# Altium footprint library Components.PcbLib: 260 footprints (part 4 of 17)
Each footprint in its own frame and in the unit in brackets; x right, y up, seen from the top. Pads: shape width x height; smd on the part's side, far side on the other; paste and mask are expansions set on the pad; w line width, h text height; cw(c..) or ccw(c..) is an arc to the next point about the centre after c.
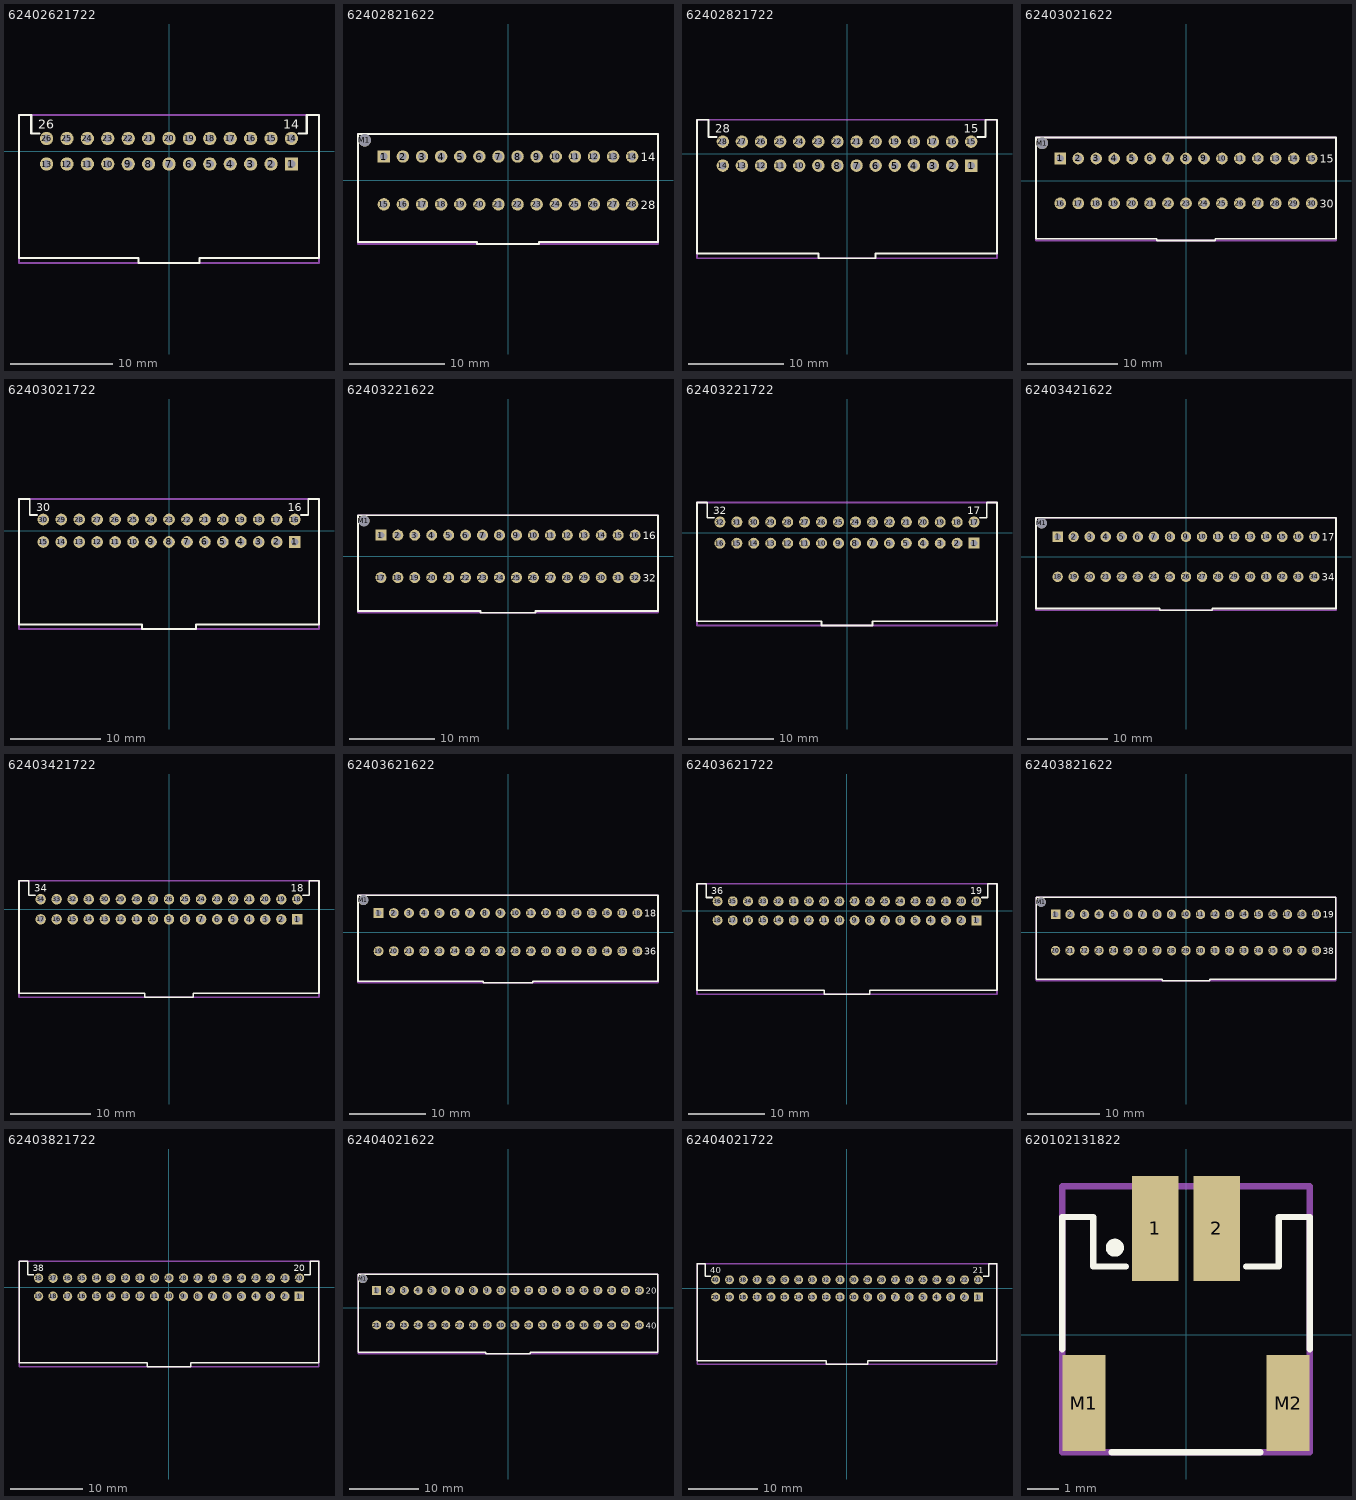
[diagram p3: the footprints below, top view; thin cyan lines are the x and y axes]

## 62402621722 [mm] "2.00mm Male Dual Row Horizontal Shrouded Header with positive locking, 26p"
height 11.7
pads (26):
  rect 1.3x1.3 hole 0.8: 1(12,-1.25)
  round 1.3 hole 0.8: 2(10,-1.25) 3(8,-1.25) 4(6,-1.25) 5(4,-1.25) 6(2,-1.25) 7(0,-1.25) 8(-2,-1.25) 9(-4,-1.25) 10(-6,-1.25) 11(-8,-1.25) 12(-10,-1.25) 13(-12,-1.25) 14(12,1.25) 15(10,1.25) 16(8,1.25) 17(6,1.25) 18(4,1.25) 19(2,1.25) 20(0,1.25) 21(-2,1.25) 22(-4,1.25) 23(-6,1.25) 24(-8,1.25) 25(-10,1.25) 26(-12,1.25)
Top Overlay:
  lines w0.2: -12.68,1.75 -13.5,1.75 -13.5,3.55 -14.7,3.55 -14.7,-10.45 -3,-10.45 -3,-10.95 3,-10.95 3,-10.45 14.7,-10.45 14.7,3.55 13.5,3.55 13.5,1.75 12.68,1.75
  text "14" at 11.2,2.2 h0.89
  text "26" at -12.8,2.2 h0.89
Mechanical 13:
  lines w0.2: -14.7,-10.95 -14.7,3.55 14.7,3.55 14.7,-10.95 -14.7,-10.95
3D body "62402621722.stp": height 11.75, standoff -3.15, extent -14.7,-10.95 14.7,3.55

## 62402821622 [mm] "2.00mm Male Dual Row Vertical Shrouded Header with positive locking, 28p"
height 11.6
pads (29):
  rect 1.3x1.3 hole 0.8: 1(-13,2.5)
  round 1.3 hole 0.8: 2(-11,2.5) 3(-9,2.5) 4(-7,2.5) 5(-5,2.5) 6(-3,2.5) 7(-1,2.5) 8(1,2.5) 9(3,2.5) 10(5,2.5) 11(7,2.5) 12(9,2.5) 13(11,2.5) 14(13,2.5) 15(-13,-2.5) 16(-11,-2.5) 17(-9,-2.5) 18(-7,-2.5) 19(-5,-2.5) 20(-3,-2.5) 21(-1,-2.5) 22(1,-2.5) 23(3,-2.5) 24(5,-2.5) 25(7,-2.5) 26(9,-2.5) 27(11,-2.5) 28(13,-2.5)
  round 1.3 hole 1.3 unplated: M1(-15,4.2)
Top Overlay:
  lines w0.2: -15.7,-6.45 -15.7,4.85 15.7,4.85 15.7,-6.45 3.25,-6.45 3.25,-6.65 -3.25,-6.65 -3.25,-6.45 -15.7,-6.45
  text "14" at 13.9,2 h0.89
  text "28" at 13.9,-3 h0.89
Mechanical 13:
  lines w0.2: -15.7,-6.65 15.7,-6.65 15.7,4.85 -15.7,4.85 -15.7,-6.65
3D body "62402821622.stp": height 9.82, standoff -3.13, extent -15.7,-6.65 15.7,4.85

## 62402821722 [mm] "2.00mm Male Dual Row Horizontal Shrouded Header with positive locking, 28p"
height 11.7
pads (28):
  rect 1.3x1.3 hole 0.8: 1(13,-1.25)
  round 1.3 hole 0.8: 2(11,-1.25) 3(9,-1.25) 4(7,-1.25) 5(5,-1.25) 6(3,-1.25) 7(1,-1.25) 8(-1,-1.25) 9(-3,-1.25) 10(-5,-1.25) 11(-7,-1.25) 12(-9,-1.25) 13(-11,-1.25) 14(-13,-1.25) 15(13,1.25) 16(11,1.25) 17(9,1.25) 18(7,1.25) 19(5,1.25) 20(3,1.25) 21(1,1.25) 22(-1,1.25) 23(-3,1.25) 24(-5,1.25) 25(-7,1.25) 26(-9,1.25) 27(-11,1.25) 28(-13,1.25)
Top Overlay:
  lines w0.2: -13.68,1.75 -14.5,1.75 -14.5,3.55 -15.7,3.55 -15.7,-10.45 -3,-10.45 -3,-10.95 3,-10.95 3,-10.45 15.7,-10.45 15.7,3.55 14.5,3.55 14.5,1.75 13.68,1.75
  text "15" at 12.2,2.2 h0.89
  text "28" at -13.8,2.2 h0.89
Mechanical 13:
  lines w0.2: -15.7,-10.95 15.7,-10.95 15.7,3.55 -15.7,3.55 -15.7,-10.95
3D body "62402821722.stp": height 11.75, standoff -3.15, extent -15.7,-10.95 15.7,3.55

## 62403021622 [mm] "2.00mm Male Dual Row Vertical Shrouded Header with positive locking, 30p"
height 11.6
pads (31):
  rect 1.3x1.3 hole 0.8: 1(-14,2.5)
  round 1.3 hole 0.8: 2(-12,2.5) 3(-10,2.5) 4(-8,2.5) 5(-6,2.5) 6(-4,2.5) 7(-2,2.5) 8(0,2.5) 9(2,2.5) 10(4,2.5) 11(6,2.5) 12(8,2.5) 13(10,2.5) 14(12,2.5) 15(14,2.5) 16(-14,-2.5) 17(-12,-2.5) 18(-10,-2.5) 19(-8,-2.5) 20(-6,-2.5) 21(-4,-2.5) 22(-2,-2.5) 23(0,-2.5) 24(2,-2.5) 25(4,-2.5) 26(6,-2.5) 27(8,-2.5) 28(10,-2.5) 29(12,-2.5) 30(14,-2.5)
  round 1.3 hole 1.3 unplated: M1(-16,4.2)
Top Overlay:
  lines w0.2: -16.7,-6.45 -16.7,4.85 16.7,4.85 16.7,-6.45 3.25,-6.45 3.25,-6.65 -3.25,-6.65 -3.25,-6.45 -16.7,-6.45
  text "15" at 14.9,2 h0.89
  text "30" at 14.9,-3 h0.89
Mechanical 13:
  lines w0.2: -16.7,-6.65 -16.7,4.85 16.7,4.85 16.7,-6.65 -16.7,-6.65
3D body "62403021622.stp": height 9.82, standoff -3.13, extent -16.7,-6.65 16.7,4.85

## 62403021722 [mm] "2.00mm Male Dual Row Horizontal Shrouded Header with positive locking, 30p"
height 11.7
pads (30):
  rect 1.3x1.3 hole 0.8: 1(14,-1.25)
  round 1.3 hole 0.8: 2(12,-1.25) 3(10,-1.25) 4(8,-1.25) 5(6,-1.25) 6(4,-1.25) 7(2,-1.25) 8(0,-1.25) 9(-2,-1.25) 10(-4,-1.25) 11(-6,-1.25) 12(-8,-1.25) 13(-10,-1.25) 14(-12,-1.25) 15(-14,-1.25) 16(14,1.25) 17(12,1.25) 18(10,1.25) 19(8,1.25) 20(6,1.25) 21(4,1.25) 22(2,1.25) 23(0,1.25) 24(-2,1.25) 25(-4,1.25) 26(-6,1.25) 27(-8,1.25) 28(-10,1.25) 29(-12,1.25) 30(-14,1.25)
Top Overlay:
  lines w0.2: -14.68,1.75 -15.5,1.75 -15.5,3.55 -16.7,3.55 -16.7,-10.45 -3,-10.45 -3,-10.95 3,-10.95 3,-10.45 16.7,-10.45 16.7,3.55 15.5,3.55 15.5,1.75 14.68,1.75
  text "30" at -14.8,2.2 h0.89
  text "16" at 13.2,2.2 h0.89
Mechanical 13:
  lines w0.2: -16.7,-10.95 16.7,-10.95 16.7,3.55 -16.7,3.55 -16.7,-10.95
3D body "62403021722.stp": height 11.75, standoff -3.15, extent -16.7,-10.95 16.7,3.55

## 62403221622 [mm] "2.00mm Male Dual Row Vertical Shrouded Header with positive locking, 32p"
height 11.6
pads (33):
  rect 1.3x1.3 hole 0.8: 1(-15,2.5)
  round 1.3 hole 0.8: 2(-13,2.5) 3(-11,2.5) 4(-9,2.5) 5(-7,2.5) 6(-5,2.5) 7(-3,2.5) 8(-1,2.5) 9(1,2.5) 10(3,2.5) 11(5,2.5) 12(7,2.5) 13(9,2.5) 14(11,2.5) 15(13,2.5) 16(15,2.5) 17(-15,-2.5) 18(-13,-2.5) 19(-11,-2.5) 20(-9,-2.5) 21(-7,-2.5) 22(-5,-2.5) 23(-3,-2.5) 24(-1,-2.5) 25(1,-2.5) 26(3,-2.5) 27(5,-2.5) 28(7,-2.5) 29(9,-2.5) 30(11,-2.5) 31(13,-2.5) 32(15,-2.5)
  round 1.3 hole 1.3 unplated: M1(-17,4.2)
Top Overlay:
  lines w0.2: -17.7,-6.45 -3.25,-6.45 -3.25,-6.65 3.25,-6.65 3.25,-6.45 17.7,-6.45 17.7,4.85 -17.7,4.85 -17.7,-6.45
  text "32" at 15.9,-3 h0.89
  text "16" at 15.9,2 h0.89
Mechanical 13:
  lines w0.2: -17.7,-6.65 -17.7,4.85 17.7,4.85 17.7,-6.65 -17.7,-6.65
3D body "62403221622.stp": height 9.82, standoff -3.13, extent -17.7,-6.65 17.7,4.85

## 62403221722 [mm] "2.00mm Male Dual Row Horizontal Shrouded Header with positive locking, 32p"
height 11.7
pads (32):
  rect 1.3x1.3 hole 0.8: 1(15,-1.25)
  round 1.3 hole 0.8: 2(13,-1.25) 3(11,-1.25) 4(9,-1.25) 5(7,-1.25) 6(5,-1.25) 7(3,-1.25) 8(1,-1.25) 9(-1,-1.25) 10(-3,-1.25) 11(-5,-1.25) 12(-7,-1.25) 13(-9,-1.25) 14(-11,-1.25) 15(-13,-1.25) 16(-15,-1.25) 17(15,1.25) 18(13,1.25) 19(11,1.25) 20(9,1.25) 21(7,1.25) 22(5,1.25) 23(3,1.25) 24(1,1.25) 25(-1,1.25) 26(-3,1.25) 27(-5,1.25) 28(-7,1.25) 29(-9,1.25) 30(-11,1.25) 31(-13,1.25) 32(-15,1.25)
Top Overlay:
  lines w0.2: -15.68,1.75 -16.5,1.75 -16.5,3.55 -17.7,3.55 -17.7,-10.45 -3,-10.45 -3,-10.95 3,-10.95 3,-10.45 17.7,-10.45 17.7,3.55 16.5,3.55 16.5,1.75 15.68,1.75
  text "17" at 14.2,2.2 h0.89
  text "32" at -15.8,2.2 h0.89
Mechanical 13:
  lines w0.2: -17.7,-10.95 17.7,-10.95 17.7,3.55 -17.7,3.55 -17.7,-10.95
3D body "62403221722.stp": height 11.75, standoff -3.15, extent -17.7,-10.95 17.7,3.55

## 62403421622 [mm] "2.00mm Male Dual Row Vertical Shrouded Header with positive locking, 34p"
height 11.6
pads (35):
  rect 1.3x1.3 hole 0.8: 1(-16,2.5)
  round 1.3 hole 0.8: 2(-14,2.5) 3(-12,2.5) 4(-10,2.5) 5(-8,2.5) 6(-6,2.5) 7(-4,2.5) 8(-2,2.5) 9(0,2.5) 10(2,2.5) 11(4,2.5) 12(6,2.5) 13(8,2.5) 14(10,2.5) 15(12,2.5) 16(14,2.5) 17(16,2.5) 18(-16,-2.5) 19(-14,-2.5) 20(-12,-2.5) 21(-10,-2.5) 22(-8,-2.5) 23(-6,-2.5) 24(-4,-2.5) 25(-2,-2.5) 26(0,-2.5) 27(2,-2.5) 28(4,-2.5) 29(6,-2.5) 30(8,-2.5) 31(10,-2.5) 32(12,-2.5) 33(14,-2.5) 34(16,-2.5)
  round 1.3 hole 1.3 unplated: M1(-18,4.2)
Top Overlay:
  lines w0.2: -18.7,-6.45 -3.25,-6.45 -3.25,-6.65 3.25,-6.65 3.25,-6.45 18.7,-6.45 18.7,4.85 -18.7,4.85 -18.7,-6.45
  text "17" at 16.9,2 h0.89
  text "34" at 16.9,-3 h0.89
Mechanical 13:
  lines w0.2: -18.7,-6.65 18.7,-6.65 18.7,4.85 -18.7,4.85 -18.7,-6.65
3D body "62403421622.stp": height 9.82, standoff -3.13, extent -18.7,-6.65 18.7,4.85

## 62403421722 [mm] "2.00mm Male Dual Row Horizontal Shrouded Header with positive locking, 34p"
height 11.7
pads (34):
  rect 1.3x1.3 hole 0.8: 1(16,-1.25)
  round 1.3 hole 0.8: 2(14,-1.25) 3(12,-1.25) 4(10,-1.25) 5(8,-1.25) 6(6,-1.25) 7(4,-1.25) 8(2,-1.25) 9(0,-1.25) 10(-2,-1.25) 11(-4,-1.25) 12(-6,-1.25) 13(-8,-1.25) 14(-10,-1.25) 15(-12,-1.25) 16(-14,-1.25) 17(-16,-1.25) 18(16,1.25) 19(14,1.25) 20(12,1.25) 21(10,1.25) 22(8,1.25) 23(6,1.25) 24(4,1.25) 25(2,1.25) 26(0,1.25) 27(-2,1.25) 28(-4,1.25) 29(-6,1.25) 30(-8,1.25) 31(-10,1.25) 32(-12,1.25) 33(-14,1.25) 34(-16,1.25)
Top Overlay:
  lines w0.2: -16.68,1.75 -17.5,1.75 -17.5,3.55 -18.7,3.55 -18.7,-10.45 -3,-10.45 -3,-10.95 3,-10.95 3,-10.45 18.7,-10.45 18.7,3.55 17.5,3.55 17.5,1.75 16.68,1.75
  text "18" at 15.2,2.2 h0.89
  text "34" at -16.8,2.2 h0.89
Mechanical 13:
  lines w0.2: -18.7,-10.95 -18.7,3.55 18.7,3.55 18.7,-10.95 -18.7,-10.95
3D body "62403421722.stp": height 11.75, standoff -3.15, extent -18.7,-10.95 18.7,3.55

## 62403621622 [mm] "2.00mm Male Dual Row Vertical Shrouded Header with positive locking, 36p"
height 11.6
pads (37):
  rect 1.3x1.3 hole 0.8: 1(-17,2.5)
  round 1.3 hole 0.8: 2(-15,2.5) 3(-13,2.5) 4(-11,2.5) 5(-9,2.5) 6(-7,2.5) 7(-5,2.5) 8(-3,2.5) 9(-1,2.5) 10(1,2.5) 11(3,2.5) 12(5,2.5) 13(7,2.5) 14(9,2.5) 15(11,2.5) 16(13,2.5) 17(15,2.5) 18(17,2.5) 19(-17,-2.5) 20(-15,-2.5) 21(-13,-2.5) 22(-11,-2.5) 23(-9,-2.5) 24(-7,-2.5) 25(-5,-2.5) 26(-3,-2.5) 27(-1,-2.5) 28(1,-2.5) 29(3,-2.5) 30(5,-2.5) 31(7,-2.5) 32(9,-2.5) 33(11,-2.5) 34(13,-2.5) 35(15,-2.5) 36(17,-2.5)
  round 1.3 hole 1.3 unplated: M1(-19,4.2)
Top Overlay:
  lines w0.2: -19.7,-6.45 -3.25,-6.45 -3.25,-6.65 3.25,-6.65 3.25,-6.45 19.7,-6.45 19.7,4.85 -19.7,4.85 -19.7,-6.45
  text "18" at 17.9,2 h0.89
  text "36" at 17.9,-3 h0.89
Mechanical 13:
  lines w0.2: -19.7,-6.65 -19.7,4.85 19.7,4.85 19.7,-6.65 -19.7,-6.65
3D body "62403621622.stp": height 9.82, standoff -3.13, extent -19.7,-6.65 19.7,4.85

## 62403621722 [mm] "2.00mm Male Dual Row Horizontal Shrouded Header with positive locking, 36p"
height 11.7
pads (36):
  rect 1.3x1.3 hole 0.8: 1(17,-1.25)
  round 1.3 hole 0.8: 2(15,-1.25) 3(13,-1.25) 4(11,-1.25) 5(9,-1.25) 6(7,-1.25) 7(5,-1.25) 8(3,-1.25) 9(1,-1.25) 10(-1,-1.25) 11(-3,-1.25) 12(-5,-1.25) 13(-7,-1.25) 14(-9,-1.25) 15(-11,-1.25) 16(-13,-1.25) 17(-15,-1.25) 18(-17,-1.25) 19(17,1.25) 20(15,1.25) 21(13,1.25) 22(11,1.25) 23(9,1.25) 24(7,1.25) 25(5,1.25) 26(3,1.25) 27(1,1.25) 28(-1,1.25) 29(-3,1.25) 30(-5,1.25) 31(-7,1.25) 32(-9,1.25) 33(-11,1.25) 34(-13,1.25) 35(-15,1.25) 36(-17,1.25)
Top Overlay:
  lines w0.2: -17.68,1.75 -18.5,1.75 -18.5,3.55 -19.7,3.55 -19.7,-10.45 -3,-10.45 -3,-10.95 3,-10.95 3,-10.45 19.7,-10.45 19.7,3.55 18.5,3.55 18.5,1.75 17.68,1.75
  text "19" at 16.2,2.2 h0.89
  text "36" at -17.8,2.2 h0.89
Mechanical 13:
  lines w0.2: -19.7,-10.95 19.7,-10.95 19.7,3.55 -19.7,3.55 -19.7,-10.95
3D body "62403621722.stp": height 11.75, standoff -3.15, extent -19.7,-10.95 19.7,3.55

## 62403821622 [mm] "2.00mm Male Dual Row Vertical Shrouded Header with positive locking, 38p"
height 11.6
pads (39):
  rect 1.3x1.3 hole 0.8: 1(-18,2.5)
  round 1.3 hole 0.8: 2(-16,2.5) 3(-14,2.5) 4(-12,2.5) 5(-10,2.5) 6(-8,2.5) 7(-6,2.5) 8(-4,2.5) 9(-2,2.5) 10(0,2.5) 11(2,2.5) 12(4,2.5) 13(6,2.5) 14(8,2.5) 15(10,2.5) 16(12,2.5) 17(14,2.5) 18(16,2.5) 19(18,2.5) 20(-18,-2.5) 21(-16,-2.5) 22(-14,-2.5) 23(-12,-2.5) 24(-10,-2.5) 25(-8,-2.5) 26(-6,-2.5) 27(-4,-2.5) 28(-2,-2.5) 29(0,-2.5) 30(2,-2.5) 31(4,-2.5) 32(6,-2.5) 33(8,-2.5) 34(10,-2.5) 35(12,-2.5) 36(14,-2.5) 37(16,-2.5) 38(18,-2.5)
  round 1.3 hole 1.3 unplated: M1(-20,4.2)
Top Overlay:
  lines w0.2: -20.7,-6.45 -3.25,-6.45 -3.25,-6.65 3.25,-6.65 3.25,-6.45 20.7,-6.45 20.7,4.85 -20.7,4.85 -20.7,-6.45
  text "19" at 18.9,2 h0.89
  text "38" at 18.9,-3 h0.89
Mechanical 13:
  lines w0.2: -20.7,-6.65 20.7,-6.65 20.7,4.85 -20.7,4.85 -20.7,-6.65
3D body "62403821622.stp": height 9.82, standoff -3.13, extent -20.7,-6.65 20.7,4.85

## 62403821722 [mm] "2.00mm Male Dual Row Horizontal Shrouded Header with positive locking, 38p"
height 11.7
pads (38):
  rect 1.3x1.3 hole 0.8: 1(18,-1.25)
  round 1.3 hole 0.8: 2(16,-1.25) 3(14,-1.25) 4(12,-1.25) 5(10,-1.25) 6(8,-1.25) 7(6,-1.25) 8(4,-1.25) 9(2,-1.25) 10(0,-1.25) 11(-2,-1.25) 12(-4,-1.25) 13(-6,-1.25) 14(-8,-1.25) 15(-10,-1.25) 16(-12,-1.25) 17(-14,-1.25) 18(-16,-1.25) 19(-18,-1.25) 20(18,1.25) 21(16,1.25) 22(14,1.25) 23(12,1.25) 24(10,1.25) 25(8,1.25) 26(6,1.25) 27(4,1.25) 28(2,1.25) 29(0,1.25) 30(-2,1.25) 31(-4,1.25) 32(-6,1.25) 33(-8,1.25) 34(-10,1.25) 35(-12,1.25) 36(-14,1.25) 37(-16,1.25) 38(-18,1.25)
Top Overlay:
  lines w0.2: -18.68,1.75 -19.5,1.75 -19.5,3.55 -20.7,3.55 -20.7,-10.45 -3,-10.45 -3,-10.95 3,-10.95 3,-10.45 20.7,-10.45 20.7,3.55 19.5,3.55 19.5,1.75 18.68,1.75
  text "20" at 17.2,2.2 h0.89
  text "38" at -18.8,2.2 h0.89
Mechanical 13:
  lines w0.2: -20.7,-10.95 20.7,-10.95 20.7,3.55 -20.7,3.55 -20.7,-10.95
3D body "62403821722.stp": height 11.75, standoff -3.15, extent -20.7,-10.95 20.7,3.55

## 62404021622 [mm] "2.00mm Male Dual Row Vertical Shrouded Header with positive locking, 40p"
height 11.6
pads (41):
  rect 1.3x1.3 hole 0.8: 1(-19,2.5)
  round 1.3 hole 0.8: 2(-17,2.5) 3(-15,2.5) 4(-13,2.5) 5(-11,2.5) 6(-9,2.5) 7(-7,2.5) 8(-5,2.5) 9(-3,2.5) 10(-1,2.5) 11(1,2.5) 12(3,2.5) 13(5,2.5) 14(7,2.5) 15(9,2.5) 16(11,2.5) 17(13,2.5) 18(15,2.5) 19(17,2.5) 20(19,2.5) 21(-19,-2.5) 22(-17,-2.5) 23(-15,-2.5) 24(-13,-2.5) 25(-11,-2.5) 26(-9,-2.5) 27(-7,-2.5) 28(-5,-2.5) 29(-3,-2.5) 30(-1,-2.5) 31(1,-2.5) 32(3,-2.5) 33(5,-2.5) 34(7,-2.5) 35(9,-2.5) 36(11,-2.5) 37(13,-2.5) 38(15,-2.5) 39(17,-2.5) 40(19,-2.5)
  round 1.3 hole 1.3 unplated: M1(-21,4.2)
Top Overlay:
  lines w0.2: -21.7,-6.45 -3.25,-6.45 -3.25,-6.65 3.25,-6.65 3.25,-6.45 21.7,-6.45 21.7,4.85 -21.7,4.85 -21.7,-6.45
  text "20" at 19.9,2 h0.89
  text "40" at 19.9,-3 h0.89
Mechanical 13:
  lines w0.2: -21.7,-6.65 21.7,-6.65 21.7,4.85 -21.7,4.85 -21.7,-6.65
3D body "62404021622.stp": height 9.82, standoff -3.13, extent -21.7,-6.65 21.7,4.85

## 62404021722 [mm] "2.00mm Male Dual Row Horizontal Shrouded Header with positive locking, 40p"
height 11.7
pads (40):
  rect 1.3x1.3 hole 0.8: 1(19,-1.25)
  round 1.3 hole 0.8: 2(17,-1.25) 3(15,-1.25) 4(13,-1.25) 5(11,-1.25) 6(9,-1.25) 7(7,-1.25) 8(5,-1.25) 9(3,-1.25) 10(1,-1.25) 11(-1,-1.25) 12(-3,-1.25) 13(-5,-1.25) 14(-7,-1.25) 15(-9,-1.25) 16(-11,-1.25) 17(-13,-1.25) 18(-15,-1.25) 19(-17,-1.25) 20(-19,-1.25) 21(19,1.25) 22(17,1.25) 23(15,1.25) 24(13,1.25) 25(11,1.25) 26(9,1.25) 27(7,1.25) 28(5,1.25) 29(3,1.25) 30(1,1.25) 31(-1,1.25) 32(-3,1.25) 33(-5,1.25) 34(-7,1.25) 35(-9,1.25) 36(-11,1.25) 37(-13,1.25) 38(-15,1.25) 39(-17,1.25) 40(-19,1.25)
Top Overlay:
  lines w0.2: -19.68,1.75 -20.5,1.75 -20.5,3.55 -21.7,3.55 -21.7,-10.45 -3,-10.45 -3,-10.95 3,-10.95 3,-10.45 21.7,-10.45 21.7,3.55 20.5,3.55 20.5,1.75 19.68,1.75
  text "21" at 18.2,2.2 h0.89
  text "40" at -19.8,2.2 h0.89
Mechanical 13:
  lines w0.2: -21.7,-10.95 21.7,-10.95 21.7,3.55 -21.7,3.55 -21.7,-10.95
3D body "62404021722.stp": height 11.75, standoff -3.15, extent -21.7,-10.95 21.7,3.55

## 620102131822 [mm] "2.00mm SMT Male Horizontal Shrouded Header, 2p"
height 5.6
pads (4):
  rect 1.5x3.4 smd: 1(-1,3.435) 2(1,3.435)
  rect 1.4x3.1 smd: M1(-3.3,-2.215) M2(3.3,-2.215)
Top Overlay:
  circle w0.3: c-2.3,2.81 r0.141
  lines w0.2: -4,-0.47 -4,3.8 -3,3.8 -3,2.2 -1.95,2.2 ; -2.41,-3.8 2.41,-3.8 ; 1.95,2.2 3,2.2 3,3.8 4,3.8 4,-0.47
Mechanical 13:
  lines w0.2: -4,-3.8 4,-3.8 4,4.8 -4,4.8 -4,-3.8
3D body "620102131822.stp": height 5.65, standoff 0, extent -4,-3.8 4,4.8